# Altium footprint library THU VIEN PCB.PCBLib: 534 footprints (part 15 of 34)
Each footprint in its own frame and in the unit in brackets; x right, y up, seen from the top. Pads: shape width x height; smd on the part's side, far side on the other; paste and mask are expansions set on the pad; w line width, h text height; cw(c..) or ccw(c..) is an arc to the next point about the centre after c.
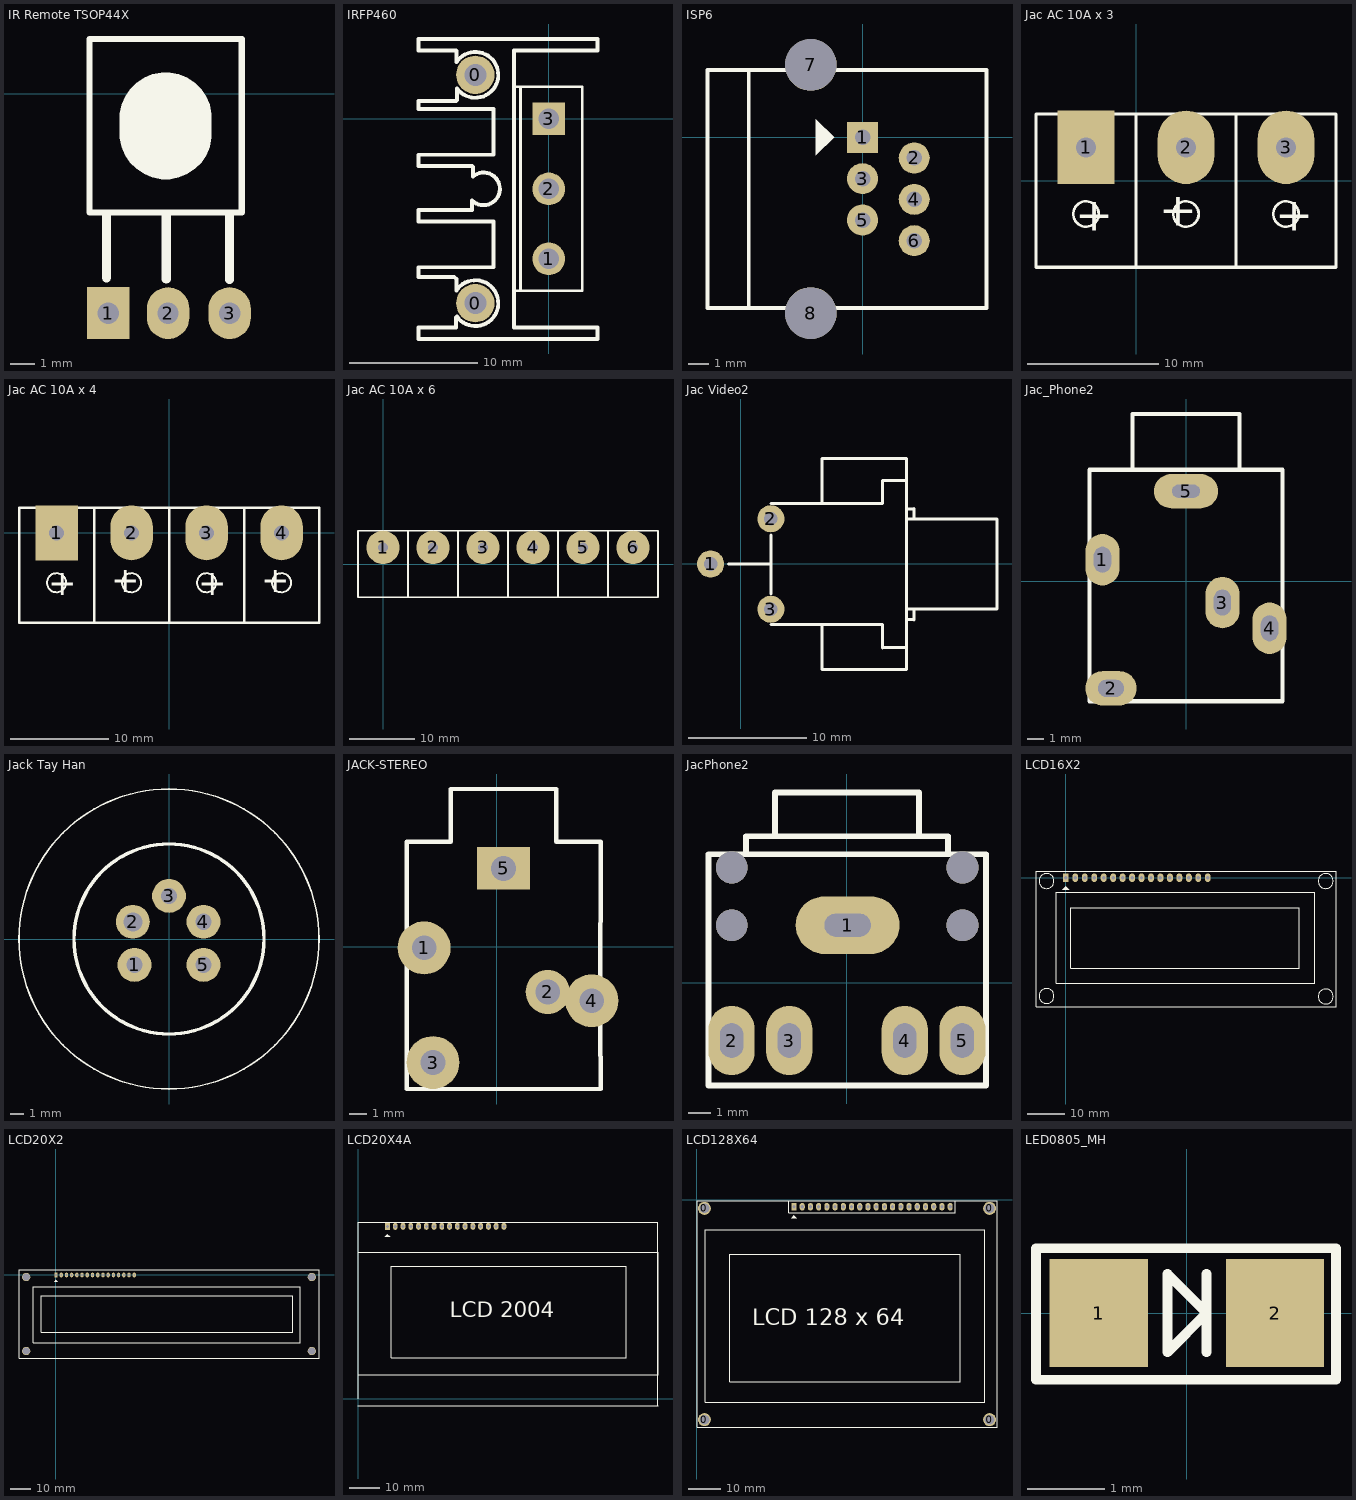
[diagram p14: the footprints below, top view; thin cyan lines are the x and y axes]

## IR Remote TSOP44X [mil]
pads (3):
  rect 70x85 hole 35: 1(-419,-360)
  oval 70x85 hole 35: 2(-321,-360) 3(-220,-360)
Top Overlay:
  region: -250,-40 -250,-65 -250,-72.39 -252.88,-86.88 -258.54,-100.53 -266.74,-112.81 -277.19,-123.26 -289.47,-131.46 -303.12,-137.12 -317.61,-140 -325,-140 -332.39,-140 -346.88,-137.12 -360.53,-131.46 -372.81,-123.26 -383.26,-112.81 -391.46,-100.53 -397.12,-86.88 -400,-72.39 -400,-65 -400,-40 -400,-32.61 -397.12,-18.12 -391.46,-4.47 -383.26,7.81 -372.81,18.26 -360.53,26.46 -346.88,32.12 -332.39,35 -325,35 -317.61,35 -303.12,32.12 -289.47,26.46 -277.19,18.26 -266.74,7.81 -258.54,-4.47 -252.88,-18.12 -250,-32.61
  lines w10: -450,-195 -450,90 -200,90 -200,-195 -450,-195
  lines w15: -422,-302 -422,-200 ; -324,-304 -324,-200 ; -220,-305 -220,-200
3D body "IR Remote TSOP44x.STEP": height 205.96, standoff -100.56, extent -438.1,-424.14 -201.88,91.82

## IRFP460 [mm]
pads (5):
  round 3 hole 1.7: 0(-5.715,-14.351) 0(-5.715,3.429)
  round 2.54 hole 1.6: 1(0,-10.9) 2(0,-5.45)
  rect 2.54x2.54 hole 1.6: 3(0,0)
Top Overlay:
  lines w0.2: -2.2,-13.4 -2.2,2.5 ; -2.7,-13.4 2.6,-13.4 2.6,2.5 -2.7,2.5 -2.7,-13.4
  lines w0.305: -2.7,2.159 -2.7,5.334 3.81,5.334 3.81,6.223 -10.16,6.223 -10.16,5.334 -7.239,5.334 -7.198,5.293 -7.198,4.418 cw(c-5.715,3.429) -7.157,2.381 -7.157,1.479 -7.239,1.397 -8.382,1.397 -10.16,1.397 -10.16,0.762 -4.318,0.762 -4.318,-2.794 -10.16,-2.794 -10.16,-3.683 -5.969,-3.683 -5.9,-3.752 -5.9,-4.48 cw(c-5.08,-5.45) -5.972,-6.354 -5.972,-7.109 -5.969,-7.112 -10.16,-7.112 -10.16,-8.001 -4.318,-8.001 -4.318,-11.557 -10.16,-11.557 -10.16,-12.319 -7.366,-12.319 -7.198,-12.487 -7.198,-13.362 cw(c-5.715,-14.351) -7.157,-15.399 -7.239,-15.482 -7.239,-16.256 -10.16,-16.256 -10.16,-17.145 3.81,-17.145 3.81,-16.256 -2.7,-16.256 -2.7,3.048

## ISP6 [mil] "Jac nap PIC"
pads (8):
  rect 60x60 hole 30: 1(0,0)
  round 60 hole 30: 2(100,-40) 3(0,-80) 4(100,-120) 5(0,-160) 6(100,-200)
  round 100 hole 100: 7(-100,140) 8(-100,-340)
Top Overlay:
  region: -55,0 -90,35 -90,-35
  lines w7: -220,-330 -220,130
  lines w8: -300,-330 -300,130 240,130 240,-330 -300,-330

## Jac AC 10A x 3 [mil] "Jac nguon 220V 10A"
pads (3):
  rect 170x220 hole 60: 1(-150,100)
  oval 170x220 hole 60: 2(150,100) 3(450,100)
Top Overlay:
  circle w8: c450,-100 r38.08
  circle w8: c150,-100 r38.08
  circle w8: c-150,-100 r38.08
  lines w10: 0,-260 0,200 ; 300,-260 600,-260 600,200 300,200 ; 300,-260 300,200 ; 300,-260 -300,-260 -300,200 300,200 ; 300,-260 300,-200 ; 300,-200 300,200 ; 300,-200 300,200
  text "+" at 417,-150 h100
  text "+" at 183,-50 h100
  text "+" at -183,-150 h100

## Jac AC 10A x 4 [mil] "Jac nguon 220V 10A"
pads (4):
  rect 170x220 hole 60: 1(-450,0)
  oval 170x220 hole 60: 2(-150,0) 3(150,0) 4(450,0)
Top Overlay:
  circle w8: c-450,-200 r38.08
  circle w8: c-150,-200 r38.08
  circle w8: c150,-200 r38.08
  circle w8: c450,-200 r38.08
  lines w10: -300,-360 -300,100 ; 300,-360 300,100 ; 0,-360 0,-300 ; 0,-360 -600,-360 -600,100 0,100 ; 0,-360 0,100 ; 0,-360 600,-360 600,-300 ; 0,-300 0,100 ; 0,-300 0,100 ; 0,100 600,100 ; 600,-300 600,100 ; 600,-300 600,100
  text "+" at -483,-250 h100
  text "+" at -117,-150 h100
  text "+" at 117,-250 h100
  text "+" at 483,-150 h100

## Jac AC 10A x 6 [mil] "Jac nguon 220V 10A"
pads (6):
  round 200 hole 60: 1(0,100) 2(300,100) 3(600,100) 4(900,100) 5(1200,100) 6(1500,100)
Top Overlay:
  lines w10: 150,-200 150,200 ; 750,-200 750,200 ; 1350,-200 1350,200 ; 450,-200 1050,-200 ; 450,-200 450,200 ; 450,-200 450,200 ; 450,-200 -150,-200 -150,200 450,200 ; 450,200 1050,200 ; 1050,-200 1050,200 ; 1050,-200 1050,200 ; 1050,-200 1650,-200 1650,200 1050,200 ; 1050,-200 1050,200

## Jac Video2 [mil] "Jac Video Stereo"
pads (3):
  round 90 hole 45: 1(-100,0) 2(100,150) 3(100,-150)
Top Overlay:
  lines w10: -40,0 101,0 ; 100,-200 470,-200 ; 100,200 470,200 470,277 550,277 ; 101,-99 101,96 ; 270,200 270,350 550,350 ; 470,-277 548,-277 549,-276 ; 550,-277 550,-350 270,-350 ; 550,-150 850,-150 850,150 550,150 ; 551,-184 574,-184 575,-185 575,-151 ; 551,183 574,183 575,184 575,150 ; 270,-350 270,-200 270,-350 ; 470,-200 470,-278 470,-200 ; 550,277 550,350 ; 550,277 550,350 ; 550,-275 550,275 550,-275

## Jac_Phone2 [mil] "Jac Phone Stereo"
pads (5):
  oval 80x120 hole 40 slot 60 at 90 deg: 1(-195,50) 3(85,-50) 4(195,-110)
  oval 120x80 hole 40 slot 60 at 0 deg: 2(-175,-250)
  oval 150x80 hole 30 slot 65 at 0 deg: 5(0,210)
Top Overlay:
  lines w10: -125,262 -125,390 125,390 125,262 ; 223,-280 -225,-280 ; -225,-280 -225,260 ; -225,-280 -225,260 ; -225,260 225,260 ; 225,260 225,-280 225,260

## Jack Tay Han [mm]
pads (5):
  round 2.5 hole 1.2: 1(-2.54,-1.905) 3(0,3.175) 4(2.54,1.27) 5(2.54,-1.905)
  round 2.5 hole 1.4: 2(-2.667,1.27)
Top Overlay:
  circle w0.127: c0,0 r11.05
  circle w0.254: c0,0 r7

## JACK-STEREO [mm]
pads (5):
  round 3 hole 1.4: 1(-4.122,-0.061) 3(-3.622,-6.561) 4(5.378,-3.061)
  round 2.5 hole 1.4: 2(2.878,-2.561)
  rect 3x2.4 hole 1.4: 5(0.378,4.439)
Top Overlay:
  lines w0.254: 5.864,-4.35 5.878,-8.061 -5.122,-8.061 -5.122,4.439 -5.122,5.939 -2.625,5.939 -2.625,8.939 0.375,8.939 3.375,8.939 3.375,5.939 5.878,5.939 5.878,4.439 5.864,-1.708

## JacPhone2 [mil] "Jac Phone Stereo"
pads (5):
  oval 180x100 hole 40 slot 80 at 0 deg: 1(1,100)
  oval 80x120 hole 40 slot 60 at 90 deg: 2(-200,-100) 3(-100,-100) 4(100,-100) 5(200,-100)
via 200,100 diameter 55 hole 55
via -200,100 diameter 55 hole 55
via 200,200 diameter 55 hole 55
via -200,200 diameter 55 hole 55
Top Overlay:
  lines w10: -240,219 -240,-178 ; -175,224 -175,254 175,254 175,226 174,225 ; -125,255 -125,330 125,330 ; 125,329 125,256 126,255 ; 240,-178 -240,-178 ; -240,-178 -240,223 241,223 241,-178 -240,-178
3D body "SW3dPS-CONNECTOR, PHONE JACK, STEREO, 3.5 MM, SEE-PLUS ST-3536-02HG.STEP": height 394.3, standoff -137.19, extent -239,-201.56 233.44,353.56

## LCD16X2 [mil] "LCD dipslay 16x2, 16 pin"
height 400
pads (16):
  rect 62x90 hole 36: 1(0,0)
  oval 62x90 hole 36: 2(100,0) 3(200,0) 4(300,0) 5(400,0) 6(500,0) 7(600,0) 8(700,0) 9(800,0) 10(900,0) 11(1000,0) 12(1100,0) 13(1200,0) 14(1300,0) 15(1400,0) 16(1500,0)
Top Overlay:
  circle w7: c-204.06,-1250 r79.06
  circle w7: c-204.06,-35 r79.06
  circle w7: c2745.94,-35 r79.06
  circle w7: c2745.94,-1255 r79.06
  region: 0,-90 -35,-125 35,-125
  lines w7: -315,-1365 2855,-1365 2855,70 -315,70 -315,-1365 ; -100,-1115 2630,-1115 2630,-155 -100,-155 -100,-1115 ; 50,-955 2465,-955 2465,-315 50,-315 50,-955
3D body "LCD module 16 X 2 backlight.STEP": height 914, standoff 394, extent -314.64,-1360 2854.65,77.01

## LCD20X2 [mil] "LCD dipslay 20x2, 16 pin"
height 400
pads (20):
  rect 62x90 hole 36: 1(0,0)
  oval 62x90 hole 36: 2(100,0) 3(200,0) 4(300,0) 5(400,0) 6(500,0) 7(600,0) 8(700,0) 9(800,0) 10(900,0) 11(1000,0) 12(1100,0) 13(1200,0) 14(1300,0) 15(1400,0) 16(1500,0)
  round 157.48 hole 137.8: "Hole 0"(-570.87,-1456.69) "Hole 0"(-570.87,-39.37) "Hole 0"(4901.57,-1456.69) "Hole 0"(4901.57,-39.37)
Top Overlay:
  region: 0,-90 -35,-125 35,-125
  lines w7: -708.66,-1594.49 5039.37,-1594.49 5039.37,100 -708.66,100 -708.66,-1594.49 ; -436,-1300 4682,-1300 4682,-225 -436,-225 -436,-1300 ; -286,-1100 4532,-1100 4532,-400 -286,-400 -286,-1100
3D body "SW3dPS-Display20x2.STEP": height 198, standoff -180, extent -100,-1437 4470,33

## LCD20X4A [mil] "LCD dipslay 20x4, 16 pin"
height 400
pads (16):
  rect 62x90 hole 39: 1(374.8,2219.69)
  oval 62x90 hole 39: 2(474.8,2219.69) 3(574.8,2219.69) 4(674.8,2219.69) 5(774.8,2219.69) 6(874.8,2219.69) 7(974.8,2219.69) 8(1074.8,2219.69) 9(1174.8,2219.69) 10(1274.8,2219.69) 11(1374.8,2219.69) 12(1474.8,2219.69) 13(1574.8,2219.69) 14(1674.8,2219.69) 15(1774.8,2219.69) 16(1874.8,2219.69)
Top Overlay:
  region: 374.8,2119.69 339.8,2084.69 409.8,2084.69
  lines w7: -5,-90 3860,-90 ; -0.2,-0.31 -0.2,2269.69 3859.8,2269.69 3859.8,-90 ; 425,524.69 3450,524.69 3450,1707.69 425,1707.69 ; 425,525 425,1705 ; 0,305 0,1882.69 3860,1882.69 3860,305 0,305
  text "LCD 2004" at 1175,1045 h200
3D body "User Library-LCD20_4.STEP": height 567.32, standoff 24.02, extent 0,-92.21 3858.27,2270

## LCD128X64 [mil] "LCD Graphic 128x64, 20 pin"
height 400
pads (24):
  round 157.48 hole 118.11: 0(95,-2675) 0(95,-105) 0(3565,-2675) 0(3565,-105)
  rect 62x90 hole 39: 1(1185,-85)
  oval 62x90 hole 39: 2(1285,-85) 3(1385,-85) 4(1485,-85) 5(1585,-85) 6(1685,-85) 7(1785,-85) 8(1885,-85) 9(1985,-85) 10(2085,-85) 11(2185,-85) 12(2285,-85) 13(2385,-85) 14(2485,-85) 15(2585,-85) 16(2685,-85) 17(2785,-85) 18(2885,-85) 19(2985,-85) 20(3085,-85)
Top Overlay:
  region: 1185,-190 1150,-225 1220,-225
  lines w7: 1120,-156 3150,-156 3150,-15 1120,-15 1120,-156
  lines w10: 5,-2765 3655,-2765 3655,-15 3145,-15 15,-15 5,-15 5,-2765 ; 105,-2465 3505,-2465 3505,-365 105,-365 105,-2465 ; 405,-2215 3205,-2215 3205,-665 405,-665 405,-2215
  text "LCD 128 x 64" at 680,-1525 h200
3D body "LCD 128x64.step": height 234.65, standoff -157.48, extent 2.32,-2772.95 3667.68,-17.04

## LED0805_MH [mil] "led dán 0805"
pads (2):
  rect 50x55 smd: 1(-45,0) 2(45,0)
Top Overlay:
  lines w5: 10,-20 10,20 ; -77,-34 76,-34 76,33 -77,33 -77,-34 ; -10,-20 -10,20 10,0 -10,-20
3D body "Led SMD 0805.step": height 43.31, standoff 0, extent -39.76,-24.6 39.77,24.61